# Altium footprint library MainLibrary.PcbLib: 85 footprints (part 5 of 6)
Each footprint in its own frame and in the unit in brackets; x right, y up, seen from the top. Pads: shape width x height; smd on the part's side, far side on the other; paste and mask are expansions set on the pad; w line width, h text height; cw(c..) or ccw(c..) is an arc to the next point about the centre after c.
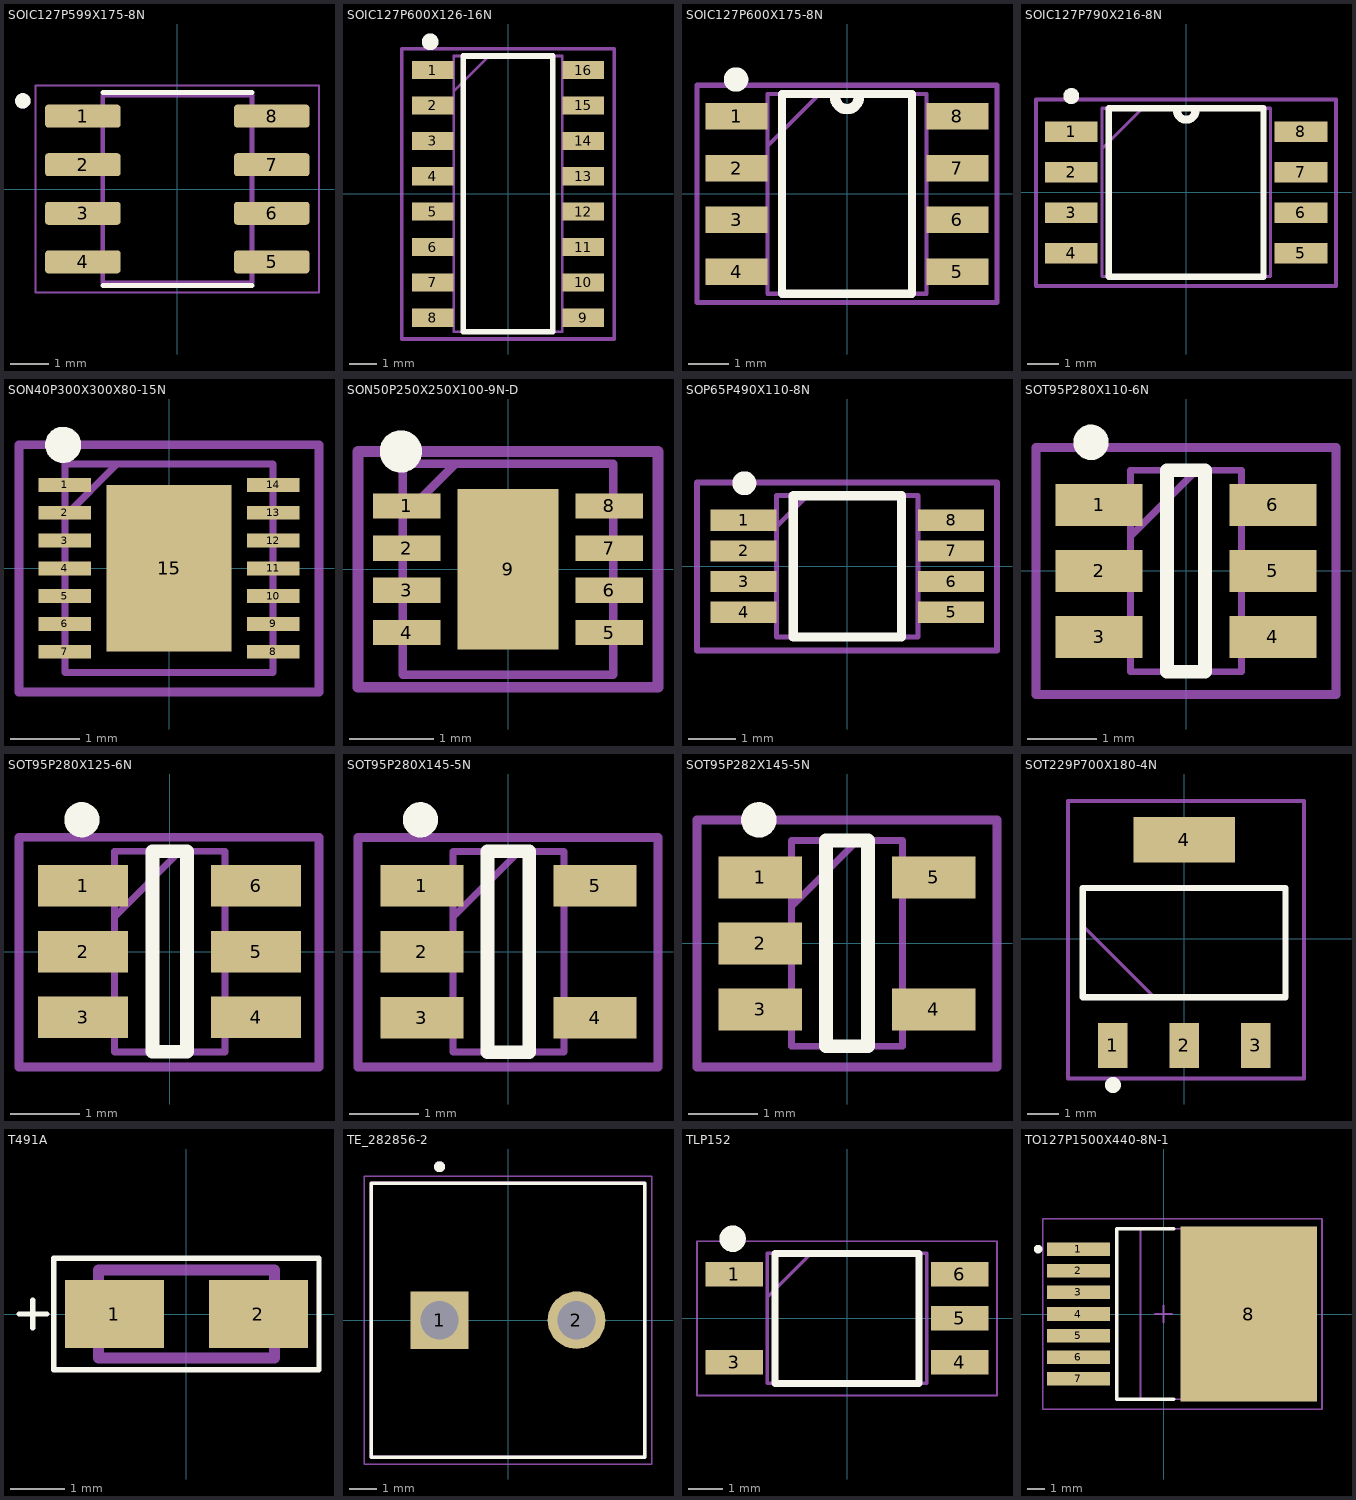
[diagram p4: the footprints below, top view; thin cyan lines are the x and y axes]

## SOIC127P599X175-8N [mm]
pads (8):
  rrect25% 1.97x0.6 smd: 1(-2.47,1.905) 2(-2.47,0.635) 3(-2.47,-0.635) 4(-2.47,-1.905) 5(2.47,-1.905) 6(2.47,-0.635) 7(2.47,0.635) 8(2.47,1.905)
Top Overlay:
  circle w0.2: c-4.04,2.305 r0.1
  lines w0.127: -1.95,-2.525 1.95,-2.525 ; -1.95,2.525 1.95,2.525
Mechanical 13:
  circle w0.2: c-4.04,2.305 r0.1
  lines w0.127: -1.95,-2.452 -1.95,2.452 1.95,2.452 1.95,-2.452 -1.95,-2.452
Mechanical 15:
  lines w0.05: -3.705,-2.702 -3.705,2.702 3.705,2.702 3.705,-2.702 -3.705,-2.702
3D body "MCP2551-I_SN.STEP": height 1.75, standoff 0, extent -3,-2.45 3,2.45

## SOIC127P600X126-16N [mm]
pads (16):
  rect 1.5x0.65 smd: 1(-2.7,4.445) 2(-2.7,3.175) 3(-2.7,1.905) 4(-2.7,0.635) 5(-2.7,-0.635) 6(-2.7,-1.905) 7(-2.7,-3.175) 8(-2.7,-4.445) 9(2.7,-4.445) 10(2.7,-3.175) 11(2.7,-1.905) 12(2.7,-0.635) 13(2.7,0.635) 14(2.7,1.905) 15(2.7,3.175) 16(2.7,4.445)
Top Overlay:
  circle w0.4: c-2.794,5.461 r0.1
  lines w0.2: -1.6,-4.95 1.6,-4.95 1.6,4.95 -1.6,4.95 -1.6,-4.95
Mechanical 13:
  lines w0.1: -1.95,3.68 -0.68,4.95 ; -1.95,-4.95 1.95,-4.95 1.95,4.95 -1.95,4.95 -1.95,-4.95
Mechanical 15:
  lines w0.127: -3.81,-5.207 3.81,-5.207 3.81,5.207 -3.81,5.207 -3.81,-5.207
3D body "PAM8406DR.stp": height 1.26, standoff 0, extent -3,-4.95 3,4.95

## SOIC127P600X175-8N [mm]
pads (8):
  rect 1.525x0.65 smd: 1(-2.712,1.905) 2(-2.712,0.635) 3(-2.712,-0.635) 4(-2.712,-1.905) 5(2.712,-1.905) 6(2.712,-0.635) 7(2.712,0.635) 8(2.712,1.905)
Top Overlay:
  circle w0.4: c-2.725,2.811 r0.1
  lines w0.2: -1.6,-2.45 -1.6,2.45 1.6,2.45 1.6,-2.45 -1.6,-2.45
  lines w0.254: -0.291,2.374 ccw(c0,2.374) 0.291,2.374
Mechanical 13:
  lines w0.1: -1.95,1.18 -0.68,2.45 ; -1.95,-2.45 -1.95,2.45 1.95,2.45 1.95,-2.45 -1.95,-2.45
Mechanical 15:
  lines w0.127: -3.683,-2.667 3.683,-2.667 3.683,2.667 -3.683,2.667 -3.683,-2.667
3D body "MCP2551-I_SN.STEP": height 1.75, standoff 0, extent -3,-2.45 3,2.45

## SOIC127P790X216-8N [mm]
pads (8):
  rect 1.65x0.65 smd: 1(-3.6,1.905) 2(-3.6,0.635) 3(-3.6,-0.635) 4(-3.6,-1.905) 5(3.6,-1.905) 6(3.6,-0.635) 7(3.6,0.635) 8(3.6,1.905)
Top Overlay:
  circle w0.25: c-3.605,3.023 r0.125
  lines w0.2: -2.425,-2.64 -2.425,2.64 2.425,2.64 2.425,-2.64 -2.425,-2.64
  lines w0.254: -0.29,2.573 ccw(c0.001,2.573) 0.292,2.573
Mechanical 13:
  lines w0.1: -2.64,1.37 -1.37,2.64 ; -2.64,-2.64 -2.64,2.64 2.64,2.64 2.64,-2.64 -2.64,-2.64
Mechanical 15:
  lines w0.127: -4.712,-2.934 4.699,-2.934 4.699,2.921 -4.712,2.921 -4.712,-2.934
3D body "W25Q16JVSSIQ_TR.stp": height 2.16, standoff 0, extent -3.95,-2.64 3.95,2.64

## SON40P300X300X80-15N [mm]
pads (15):
  rect 0.75x0.2 smd: 1(-1.5,1.2) 2(-1.5,0.8) 3(-1.5,0.4) 4(-1.5,0) 5(-1.5,-0.4) 6(-1.5,-0.8) 7(-1.5,-1.2) 8(1.5,-1.2) 9(1.5,-0.8) 10(1.5,-0.4) 11(1.5,0) 12(1.5,0.4) 13(1.5,0.8) 14(1.5,1.2)
  rect 1.8x2.4 smd: 15(0,0)
Top Overlay:
  circle w0.27: c-1.524,1.778 r0.125
Mechanical 13:
  lines w0.1: -1.5,0.75 -0.75,1.5 ; -1.5,-1.5 -1.5,1.5 1.5,1.5 1.5,-1.5 -1.5,-1.5
Mechanical 15:
  lines w0.127: -2.159,-1.778 2.159,-1.778 2.159,1.778 -2.159,1.778 -2.159,-1.778
3D body "MAX9814ETD+T.stp": height 0.8, standoff 0, extent -1.55,-1.5 1.55,1.5

## SON50P250X250X100-9N-D [mm]
pads (9):
  rect 0.8x0.3 smd: 1(-1.2,0.75) 2(-1.2,0.25) 3(-1.2,-0.25) 4(-1.2,-0.75) 5(1.2,-0.75) 6(1.2,-0.25) 7(1.2,0.25) 8(1.2,0.75)
  rect 1.2x1.9 smd: 9(0,0)
Top Overlay:
  circle w0.25: c-1.27,1.397 r0.125
Mechanical 13:
  lines w0.1: -1.25,0.625 -0.625,1.25 ; -1.25,-1.25 -1.25,1.25 1.25,1.25 1.25,-1.25 -1.25,-1.25
Mechanical 15:
  lines w0.127: -1.778,-1.397 1.778,-1.397 1.778,1.397 -1.778,1.397 -1.778,-1.397
3D body "SHT30-DIS-B.stp": height 1, standoff 0, extent -1.3,-1.25 1.3,1.25

## SOP65P490X110-8N [mm]
pads (8):
  rect 1.4x0.45 smd: 1(-2.2,0.975) 2(-2.2,0.325) 3(-2.2,-0.325) 4(-2.2,-0.975) 5(2.2,-0.975) 6(2.2,-0.325) 7(2.2,0.325) 8(2.2,0.975)
Top Overlay:
  circle w0.254: c-2.185,1.761 r0.127
  lines w0.2: -1.15,-1.5 1.15,-1.5 1.15,1.5 -1.15,1.5 -1.15,-1.5
Mechanical 13:
  lines w0.1: -1.5,0.85 -0.85,1.5 ; -1.5,-1.5 1.5,-1.5 1.5,1.5 -1.5,1.5 -1.5,-1.5
Mechanical 15:
  lines w0.127: -3.188,-1.791 3.175,-1.791 3.175,1.778 -3.188,1.778 -3.188,-1.791
3D body "MCP6002-I_MS.STEP": height 1.1, standoff 0, extent -2.45,-1.5 2.45,1.5

## SOT95P280X110-6N [mm]
pads (6):
  rect 1.25x0.6 smd: 1(-1.25,0.95) 2(-1.25,0) 3(-1.25,-0.95) 4(1.25,-0.95) 5(1.25,0) 6(1.25,0.95)
Top Overlay:
  circle w0.254: c-1.367,1.852 r0.127
  lines w0.2: -0.275,-1.45 0.275,-1.45 0.275,1.45 -0.275,1.45 -0.275,-1.45
Mechanical 13:
  lines w0.1: -0.8,0.5 0.15,1.45 ; -0.8,-1.45 0.8,-1.45 0.8,1.45 -0.8,1.45 -0.8,-1.45
Mechanical 15:
  lines w0.127: -2.159,-1.778 2.159,-1.778 2.159,1.778 -2.159,1.778 -2.159,-1.778
3D body "TPS54302DDCR.stp": height 0.97, standoff 0, extent -1.4,-1.45 1.4,1.45

## SOT95P280X125-6N [mm]
pads (6):
  rect 1.3x0.6 smd: 1(-1.25,0.95) 2(-1.25,0) 3(-1.25,-0.95) 4(1.25,-0.95) 5(1.25,0) 6(1.25,0.95)
Top Overlay:
  circle w0.254: c-1.27,1.905 r0.127
  lines w0.2: -0.25,-1.45 0.25,-1.45 0.25,1.45 -0.25,1.45 -0.25,-1.45
Mechanical 13:
  lines w0.1: -0.8,0.5 0.15,1.45 ; -0.8,-1.45 0.8,-1.45 0.8,1.45 -0.8,1.45 -0.8,-1.45
Mechanical 15:
  lines w0.127: -2.178,-1.67 2.159,-1.67 2.159,1.651 -2.178,1.651 -2.178,-1.67
3D body "AOZ1282CI.stp": height 1.25, standoff 0, extent -1.4,-1.45 1.4,1.45

## SOT95P280X145-5N [mm]
pads (5):
  rect 1.2x0.6 smd: 1(-1.25,0.95) 2(-1.25,0) 3(-1.25,-0.95) 4(1.25,-0.95) 5(1.25,0.95)
Top Overlay:
  circle w0.254: c-1.27,1.905 r0.127
  lines w0.2: -0.3,-1.45 -0.3,1.45 0.3,1.45 0.3,-1.45 -0.3,-1.45
Mechanical 13:
  lines w0.1: -0.8,0.5 0.15,1.45 ; -0.8,-1.45 -0.8,1.45 0.8,1.45 0.8,-1.45 -0.8,-1.45
Mechanical 15:
  lines w0.127: -2.172,-1.664 2.159,-1.664 2.159,1.651 -2.172,1.651 -2.172,-1.664
3D body "LM321MFX.stp": height 1.2, standoff 0, extent -1.4,-1.45 1.4,1.45

## SOT95P282X145-5N [mm]
pads (5):
  rect 1.2x0.6 smd: 1(-1.25,0.95) 2(-1.25,0) 3(-1.25,-0.95) 4(1.25,-0.95) 5(1.25,0.95)
Top Overlay:
  circle w0.254: c-1.27,1.778 r0.127
  lines w0.2: -0.3,-1.48 -0.3,1.48 0.3,1.48 0.3,-1.48 -0.3,-1.48
Mechanical 13:
  lines w0.1: -0.8,0.53 0.15,1.48 ; -0.8,-1.48 -0.8,1.48 0.8,1.48 0.8,-1.48 -0.8,-1.48
Mechanical 15:
  lines w0.127: -2.159,-1.778 2.159,-1.778 2.159,1.778 -2.159,1.778 -2.159,-1.778
3D body "AP2127K-1.8TRG1.stp": height 1.45, standoff 0, extent -1.412,-1.48 1.412,1.48

## SOT229P700X180-4N [mm]
pads (4):
  rect 0.95x1.45 smd: 1(-2.29,-3.427) 2(0,-3.427) 3(2.29,-3.427)
  rect 3.25x1.45 smd: 4(0,3.173)
Top Overlay:
  circle w0.254: c-2.286,-4.699 r0.127
  lines w0.2: -3.252,-1.879 -3.252,1.625 3.252,1.625 3.252,-1.879 -3.252,-1.879
Mechanical 13:
  lines w0.1: -3.252,0.411 -0.962,-1.879 ; -3.252,-1.879 -3.252,1.625 3.252,1.625 3.252,-1.879 -3.252,-1.879
Mechanical 15:
  lines w0.127: -3.727,-4.489 -3.727,4.413 3.842,4.413 3.842,-4.489 -3.727,-4.489
3D body "AMS1117.STEP": height 1.8, standoff 0, extent -3.251,-3.626 3.251,3.372

## T491A [mm]
pads (2):
  rect 1.8x1.23 smd: 1(-1.31,0) 2(1.31,0)
Top Overlay:
  lines w0.1: -3.048,0 -2.54,0 ; -2.794,-0.254 -2.794,0.254 ; -2.413,-1.016 -2.413,1.016 2.413,1.016 2.413,-1.016 -2.413,-1.016
Mechanical 13:
  lines w0.2: -1.6,-0.8 -1.6,0.8 1.6,0.8 1.6,-0.8 -1.6,-0.8
Mechanical 15:
  lines w0.05: -2.413,-1.016 -2.413,1.016 2.413,1.016 2.413,-1.016 -2.413,-1.016
3D body "T491A106K016AT.stp": height 1.81, standoff 0, extent -1.7,-0.9 1.7,0.9

## TE_282856-2 [mm]
pads (2):
  rect 2.1x2.1 / inner round 2.1 / far side rect 2.1x2.1 hole 1.4: 1(-2.5,0)
  round 2.1 hole 1.4: 2(2.5,0)
Top Overlay:
  circle w0.2: c-2.5,5.6 r0.1
  lines w0.127: -5,-5 -5,5 5,5 5,-5 -5,-5
Mechanical 13:
  circle w0.2: c-2.5,5.6 r0.1
  lines w0.127: -5,-5 -5,5 5,5 5,-5 -5,-5
Mechanical 15:
  lines w0.05: -5.25,-5.25 -5.25,5.25 5.25,5.25 5.25,-5.25 -5.25,-5.25
3D body "step_temp.STEP": height 19, standoff -3.5, extent -5,-5 5.5,5

## TLP152 [mm]
pads (5):
  rect 1.65x0.7 smd: 1(-3.253,1.262) 3(-3.253,-1.278) 4(3.247,-1.278) 5(3.247,-0.008) 6(3.247,1.262)
Top Overlay:
  circle w0.4: c-3.302,2.286 r0.18
  lines w0.2: -2.078,-1.883 -2.078,1.867 2.072,1.867 2.072,-1.883 -2.078,-1.883
Mechanical 13:
  lines w0.1: -2.303,0.597 -1.033,1.867 ; -2.303,-1.883 -2.303,1.867 2.297,1.867 2.297,-1.883 -2.303,-1.883
Mechanical 15:
  lines w0.05: -4.328,-2.233 -4.328,2.217 4.322,2.217 4.322,-2.233 -4.328,-2.233
3D body "TLP152.STEP": height 2.3, standoff 0, extent -3.5,-1.85 3.5,1.85

## TO127P1500X440-8N-1 [mm] "TO,1.27mm pitch;7 pin,15.00mm L X 9.25mm W X 4.40mm H body"
height 4.4
pads (8):
  rect 3.7x0.8 smd paste+0 mask+0: 1(-5,3.81) 2(-5,2.54) 3(-5,1.27) 4(-5,0) 5(-5,-1.27) 6(-5,-2.54) 7(-5,-3.81)
  rect 8x10.25 smd paste+0 mask+0: 8(5,0)
Top Overlay:
  circle w0.25: c-7.366,3.81 r0.125
  lines w0.2: 0.6,-5 -2.75,-5 -2.75,5 0.6,5
Mechanical 13:
  lines w0.1: -1.35,-5 7.9,-5 7.9,5 -1.35,5 -1.35,-5
Mechanical 15:
  lines w0.1: -0.5,0 0.5,0 ; 0,-0.5 0,0.5 ; -7.1,-5.6 9.3,-5.6 9.3,5.6 -7.1,5.6 -7.1,-5.6
3D body "PG-TO263-7-1_C66065-A6551-C014-05-0004.stp": height 4.51, standoff 0, extent -6.4,-5 8.55,5